# Altium footprint library PCBLIB.PcbLib: 775 footprints (part 22 of 49)
Each footprint in its own frame and in the unit in brackets; x right, y up, seen from the top. Pads: shape width x height; smd on the part's side, far side on the other; paste and mask are expansions set on the pad; w line width, h text height; cw(c..) or ccw(c..) is an arc to the next point about the centre after c.
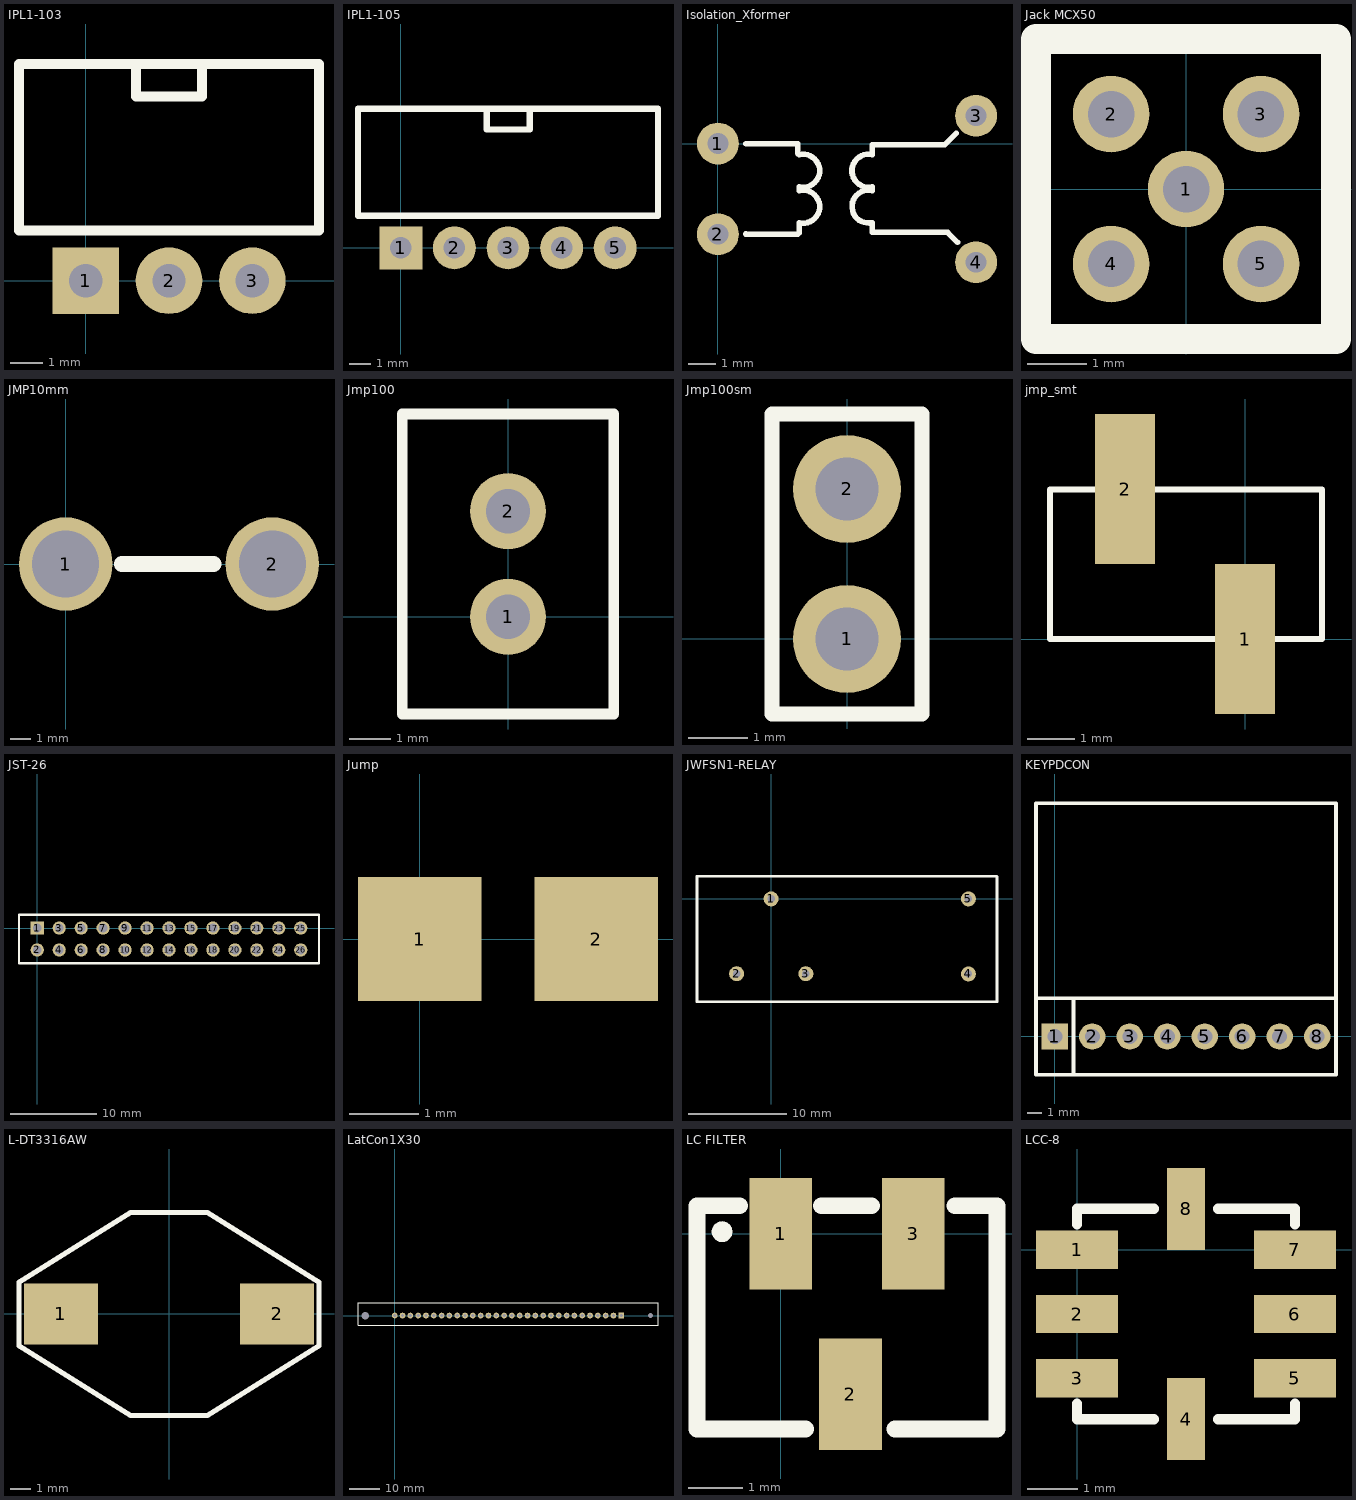
[diagram p21: the footprints below, top view; thin cyan lines are the x and y axes]

## IPL1-103 [mil]
height 270
pads (3):
  rect 80x80 hole 40: 1(0,0)
  round 80 hole 40: 2(100,0) 3(200,0)
TopOverlay:
  lines w12: 60.11,260 60.11,221.01 139.89,221.01 139.89,258.02 ; -80,60 -80,260 280,260 280,60 -80,60
  text "." at -90.19,-20.32 h300

## IPL1-105 [mil]
height 270
pads (5):
  rect 80x80 hole 40: 1(0,0)
  round 80 hole 40: 2(100,0) 3(200,0) 4(300,0) 5(400,0)
TopOverlay:
  lines w12: 160.56,260 160.56,221.01 240.34,221.01 240.34,258.02 ; -80,60 480,60 480,260 -80,260 -80,60
  text "." at -90.19,-20.32 h300

## Isolation_Xformer [mil]
height 30
pads (4):
  round 60 hole 30: 1(0,0) 2(0,-130) 3(370.07,39.9) 4(370.07,-170.1)
TopOverlay:
  lines w8: 39.79,-129.65 114.59,-129.86 ; 40.22,-0.17 114.59,0 114.59,-14.19 ; 102.61,-129.83 114.62,-129.83 ; 116.48,-67.58 cw(c122.2,-90.45) 116.56,-113.35 116.56,-127.89 114.62,-129.83 ; 116.48,-16.08 cw(c122.2,-38.96) 116.56,-61.86 116.56,-67.5 ; 256.6,-127.38 329.18,-127.38 343.5,-141.7 ; 262.62,-1.46 325.43,-1.46 341.78,14.89 ; 286.41,-127.38 221.48,-127.38 221.48,-113.19 cw(c215.76,-90.31) 221.4,-67.41 221.41,-61.77 cw(c215.69,-38.89) 221.33,-15.99 221.33,-1.46 287.15,-1.46

## Jack MCX50 [mil] "Straight Jack Receptacle"
height 220.87
pads (5):
  round 51 hole 31: 1(0,0) 2(-50,50) 3(50,50) 4(-50,-50) 5(50,-50)
TopOverlay:
  lines w20: -100,-100 -100,100 100,100 100,-100 -100,-100

## JMP10mm [mil]
pads (2):
  round 178 hole 128: 1(0,0) 2(394,0)
TopOverlay:
  lines w30: 107,0 282,0
Mechanical4:
  text ".315" at 0,0 h1

## Jmp100 [mil]
pads (2):
  round 72 hole 42: 1(0,0) 2(0,100)
TopOverlay:
  lines w10: -100,-92 100,-92 100,192 -100,192 -100,-92
Mechanical4:
  text ".350" at 0,0 h1

## Jmp100sm [mil]
pads (2):
  round 72 hole 42: 1(0,0) 2(0,100)
TopOverlay:
  lines w10: -50,-50 50,-50 50,150 -50,150 -50,-50
Mechanical4:
  text ".350" at 0,0 h1

## jmp_smt [mil]
pads (2):
  rect 50x125 smd: 1(0,0) 2(-100,125)
TopOverlay:
  lines w5: -162.66,0.01 -162.66,124.59 64.13,124.59 64.13,0.01 -162.66,0.01

## JST-26 [mil]
pads (26):
  rect 60x60 hole 40: 1(0,0)
  round 60 hole 40: 2(0,-100) 3(100,0) 4(100,-100) 5(200,0) 6(200,-100) 7(300,0) 8(300,-100) 9(400,0) 10(400,-100) 11(500,0) 12(500,-100) 13(600,0) 14(600,-100) 15(700,0) 16(700,-100) 17(800,0) 18(800,-100) 19(900,0) 20(900,-100) 21(1000,0) 22(1000,-100) 23(1100,0) 24(1100,-100) 25(1200,0) 26(1200,-100)
TopOverlay:
  lines w10: -83,-160 1283,-160 1283,60 -83,60 -83,-160

## Jump [mil]
pads (2):
  rect 70x70 smd: 1(0,0) 2(100,0)
Mechanical4:
  text "0" at 0,0 h1

## JWFSN1-RELAY [mil]
pads (5):
  round 60 hole 30: 1(0,0) 2(-137.79,-299.21) 3(138.78,-299.21) 4(788.39,-300.2) 5(788.39,0)
TopOverlay:
  lines w10: -296.26,-410.43 901.58,-410.43 ; -296.26,-409.45 -296.26,89.57 901.58,89.57 ; 902.56,-410.43 902.56,88.58

## KEYPDCON [mil]
pads (8):
  rect 70x70 hole 40: 1(0,0)
  round 70 hole 40: 2(100,0) 3(200,0) 4(300,0) 5(400,0) 6(500,0) 7(600,0) 8(700,0)
TopOverlay:
  lines w10: 50,-102 50,102 ; -50,102 -50,622 750,622 750,102 ; -50,102 -50,-102 750,-102 750,102 ; -50,102 750,102
Mechanical4:
  text ".210" at 0,0 h1

## L-DT3316AW [mil]
height 190
pads (2):
  rect 145x120 smd: 1(-212.5,0) 2(212.5,0)
TopOverlay:
  lines w10: -295,-62.5 -295,62.5 -75,200 75,200 295,62.5 295,-62.5 75,-200 -75,-200 -295,-62.5

## LatCon1X30 [mil]
pads (32):
  round 0 hole 96 unplated: 0(-375,0)
  round 0 hole 65 unplated: 0(3275,0)
  rect 73x73 hole 43: 1(2900,0)
  round 73 hole 43: 2(2800,0) 3(2700,0) 4(2600,0) 5(2500,0) 6(2400,0) 7(2300,0) 8(2200,0) 9(2100,0) 10(2000,0) 11(1900,0) 12(1800,0) 13(1700,0) 14(1600,0) 15(1500,0) 16(1400,0) 17(1300,0) 18(1200,0) 19(1100,0) 20(1000,0) 21(900,0) 22(800,0) 23(700,0) 24(600,0) 25(500,0) 26(400,0) 27(300,0) 28(200,0) 29(100,0) 30(0,0)
TopOverlay:
  lines w10: -470,-125 -470,165 3370,165 3370,-125 -470,-125

## LC FILTER [mil]
pads (4):
  rect 45x80 smd: 1(0,0) 2(50,-115) 3(95,0)
  round 15 on Top Overlay: ""(-42,1.5)
TopOverlay:
  lines w12: -29.33,20 -60,20 -60,-140 17.73,-140 ; 29,20.13 65,20.13 ; 81.69,-140 155,-140 155,20 124.74,20

## LCC-8 [mil]
pads (8):
  rect 64x30 smd: 1(0,0) 2(0,-50) 3(0,-100) 5(170,-100) 6(170,-50) 7(170,0)
  rect 30x64 smd: 4(85,-132) 8(85,32)
TopOverlay:
  lines w8: 0,-120 0,-132 60,-132 ; 0,20 0,32 60,32 ; 110,-132 170,-132 170,-120 ; 110,32 170,32 170,20
  text "." at 89,-26 h50